# Altium footprint library Components.PcbLib: 139 footprints (part 6 of 9)
Each footprint in its own frame and in the unit in brackets; x right, y up, seen from the top. Pads: shape width x height; smd on the part's side, far side on the other; paste and mask are expansions set on the pad; w line width, h text height; cw(c..) or ccw(c..) is an arc to the next point about the centre after c.
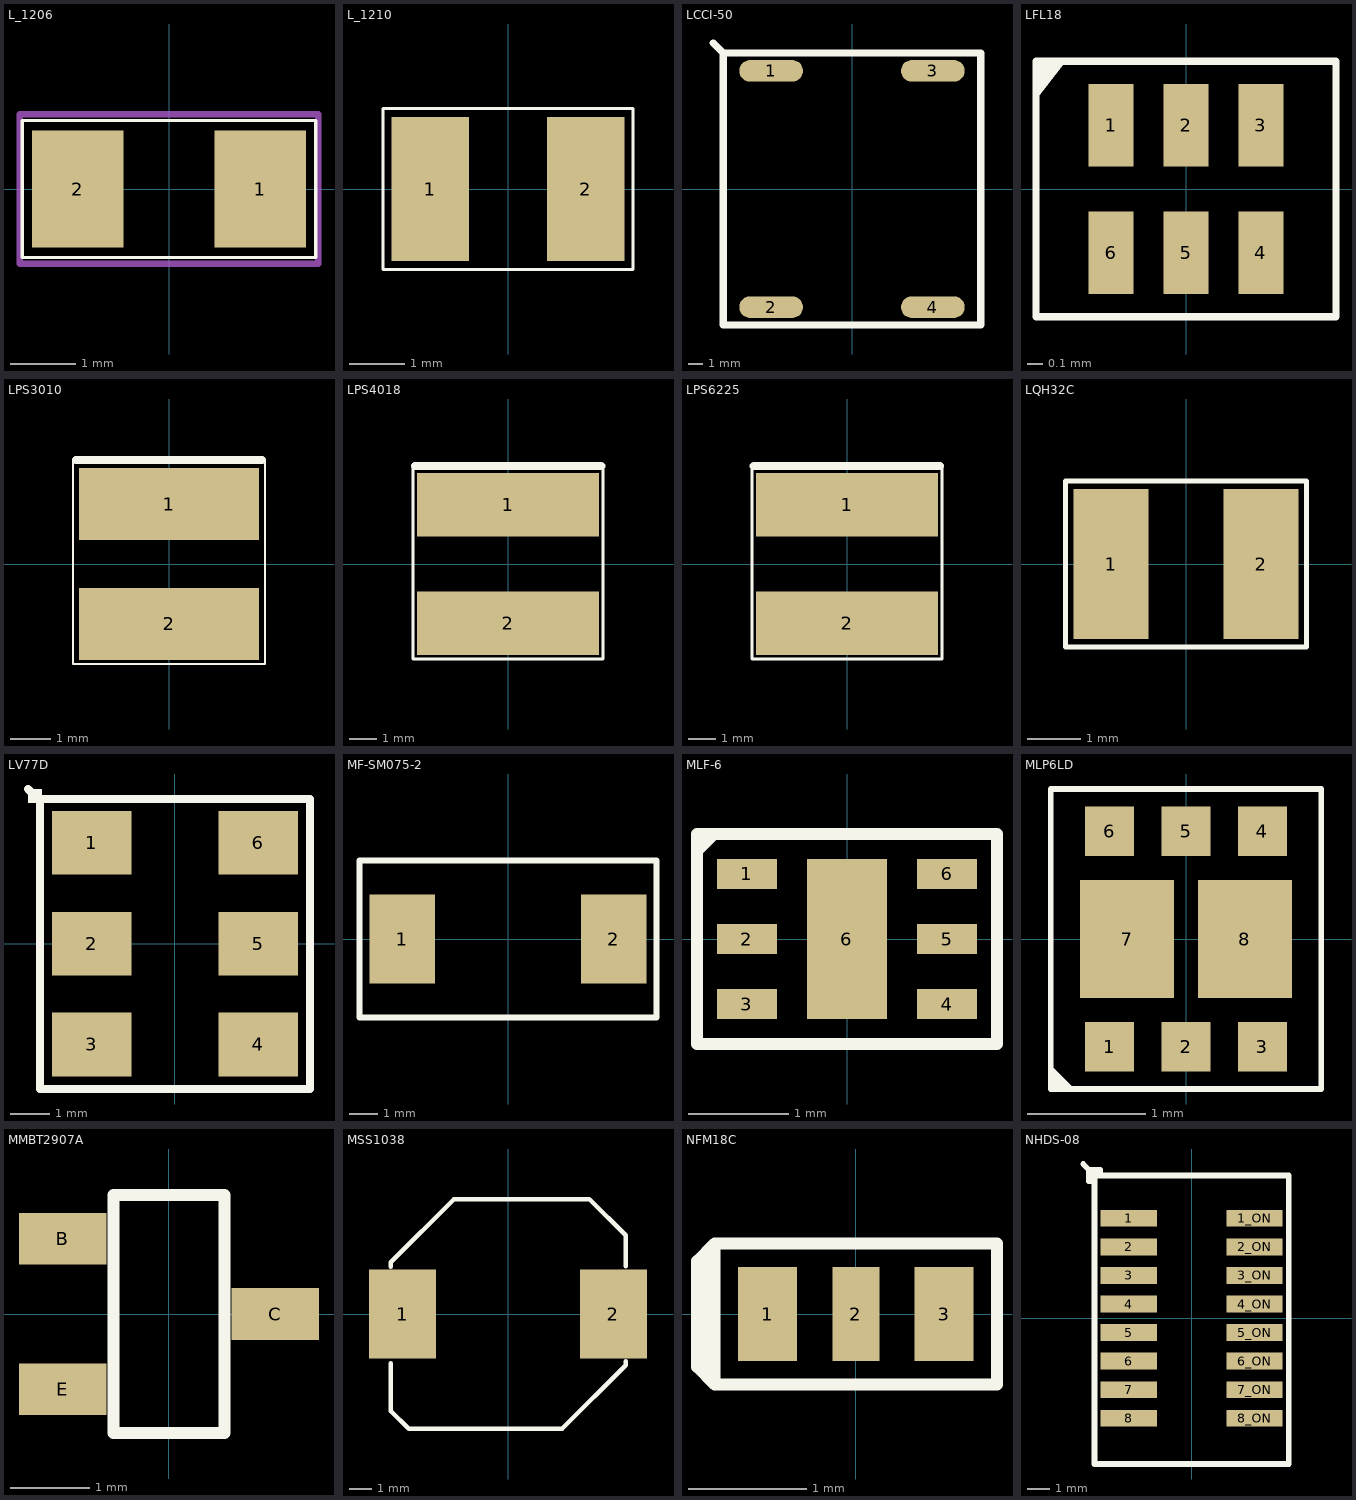
[diagram p5: the footprints below, top view; thin cyan lines are the x and y axes]

## L_1206 [mm]
pads (2):
  rect 1.4x1.8 smd paste-0.1 mask+0.05: 1(1.4,0) 2(-1.4,0)
Top Overlay:
  lines w0.05: -2.25,-1.05 -2.25,1.05 2.25,1.05 2.25,-1.05 -2.25,-1.05
Mechanical 29:
  lines w0.1: -2.286,-1.143 2.286,-1.143 2.286,1.143 -2.286,1.143 -2.286,-1.143
  text ".Designator" at -2.032,-0.381 h0.8
3D body "User Library-V1206HD.STEP": height 1.5, standoff 0, extent -1.6,-0.85 1.6,0.75

## L_1210 [mm]
pads (2):
  rect 1.4x2.6 smd paste-0.1 mask+0.05: 1(-1.4,0) 2(1.4,0)
Top Overlay:
  lines w0.05: -2.25,-1.45 -2.25,1.45 2.25,1.45 2.25,-1.45 -2.25,-1.45
3D body "User Library-V1210HD.STEP": height 1.5, standoff 0, extent -1.61,-1.3 1.59,1.2

## LCCI-50 [mm]
pads (4):
  oval 4.45x1.52 smd paste-0.1: 1(-5.65,8.255) 2(-5.65,-8.255) 3(5.65,8.255) 4(5.65,-8.255)
Top Overlay:
  lines w0.2: -9,9.5 -9,9.5
  lines w0.5: -9.7,10.2 -9,9.5 ; -9,9.5 -9,-9.5 9,-9.5 9,9.5 -9,9.5

## LFL18 [mm]
pads (6):
  rect 0.3x0.55 smd paste-0.03 mask+0.03: 1(-0.5,0.425) 2(0,0.425) 3(0.5,0.425) 4(0.5,-0.425) 5(0,-0.425) 6(-0.5,-0.425)
Top Overlay:
  region: -0.8,0.85 -1,0.6 -1,0.85
  lines w0.05: -1,-0.85 1,-0.85 1,0.85 -1,0.85 -1,-0.85

## LPS3010 [mm]
pads (2):
  rect 4.5x1.8 smd paste-0.2 mask+0.05: 1(0,1.5) 2(0,-1.5)
Top Overlay:
  lines w0.05: -2.4,2.61 -2.4,-2.5 2.4,-2.5 2.4,2.61
  lines w0.2: -2.33,2.6 2.32,2.6
3D body "Coilcraft-LPS4018.step": height 1.8, standoff 0, extent -2.053,-2.053 2.053,2.053

## LPS4018 [mm]
pads (2):
  rect 6.6x2.3 smd paste-0.2 mask+0.05: 1(0,2.15) 2(0,-2.15)
Top Overlay:
  lines w0.1: -3.45,3.49 -3.45,-3.45 3.45,-3.45 3.45,3.5
  lines w0.3: -3.38,3.56 3.39,3.56
3D body "LPS6225.STEP": height 2.5, standoff 0, extent -3.1,-3.103 3.106,3.103

## LPS6225 [mm]
pads (2):
  rect 6.6x2.3 smd paste-0.2 mask+0.05: 1(0,2.15) 2(0,-2.15)
Top Overlay:
  lines w0.1: -3.45,3.5 -3.45,-3.45 3.45,-3.45 3.45,3.49
  lines w0.3: -3.39,3.56 3.38,3.56
3D body "LPS6225.STEP": height 2.5, standoff 0, extent -3.1,-3.103 3.106,3.103

## LQH32C [mm] "Chip Inductor, 2-Leads, Body 2,5x2,5mm, IPC Medium Density"
height 2.2
pads (2):
  rect 1.4x2.8 smd paste-0.1 mask+0.1: 1(-1.4,0) 2(1.4,0)
Top Overlay:
  lines w0.1: -2.25,-1.55 2.25,-1.55 2.25,1.55 -2.25,1.55 -2.25,-1.55
3D body: height 2.2, standoff 0, extent -1.35,-1.35 1.35,1.35

## LV77D [mm]
pads (6):
  rect 2x1.6 smd paste-0.1 mask+0.1: 1(-2.1,2.54) 2(-2.1,0) 3(-2.1,-2.54) 4(2.1,-2.54) 5(2.1,0) 6(2.1,2.54)
Top Overlay:
  rectangle: -3.7,3.54 -3.35,3.89
  lines w0.2: -3.7,3.89 -3.4,3.59 ; -3.4,-3.66 3.4,-3.66 3.4,3.64 -3.4,3.64 -3.4,-3.66
3D body: height 1.7, standoff 0, extent -2.55,-3.61 2.55,3.59

## MF-SM075-2 [mm]
pads (2):
  rect 2.3x3.1 smd paste-0.2: 1(-3.7,0) 2(3.7,0)
Top Overlay:
  lines w0.2: -5.2,-2.75 -5.2,2.75 5.2,2.75 5.2,-2.75 -5.2,-2.75
3D body: height 3.2, standoff 0, extent -5.3,-2.85 5.3,2.85

## MLF-6 [mm]
pads (7):
  rect 0.6x0.3 smd paste-0.03 mask+0.03: 1(-1,0.65) 2(-1,0) 3(-1,-0.65) 4(1,-0.65) 5(1,0) 6(1,0.65)
  rect 0.8x1.6 smd paste-0.08 mask+0.05: 6(0,0)
Top Overlay:
  region: -1.5,1.05 -1.5,0.8 -1.25,1.05
  lines w0.12: -1.5,-1.05 -1.5,1.05 1.5,1.05 1.5,-1.05 -1.5,-1.05
3D body: height 0.9, standoff 0, extent -0.999,-0.999 0.999,0.999

## MLP6LD [mm]
pads (8):
  rect 0.42x0.42 smd paste-0.05 mask+0.05: 1(-0.65,-0.915) 2(0,-0.915) 3(0.65,-0.915) 4(0.65,0.915) 5(0,0.915) 6(-0.65,0.915)
  rect 0.8x1 smd paste-0.1 mask+0.05: 7(-0.5,0) 8(0.5,0)
Top Overlay:
  region: -1.15,-1.075 -0.95,-1.275 -1.15,-1.275
  lines w0.05: -1.15,-1.275 1.15,-1.275 1.15,1.275 -1.15,1.275 -1.15,-1.275

## MMBT2907A [mm]
pads (3):
  rect 1.1x0.65 smd paste-0.05 mask+0.06: B(-1.34,0.95) C(1.34,0) E(-1.34,-0.95)
Top Overlay:
  lines w0.15: -0.7,-1.5 -0.7,1.5 0.7,1.5 0.7,-1.5 -0.7,-1.5
3D body "SW3dPS-3-lead sot23-3.STEP": height 1.05, standoff 0.03, extent -1.276,-1.46 1.2,1.46

## MSS1038 [mm] "Coilcraft"
pads (2):
  rect 3x4 smd paste-0.2 mask+0.1: 1(-4.725,0) 2(4.725,0)
Top Overlay:
  lines w0.2: -5.25,-2.2 -5.25,-4.35 -4.45,-5.15 2.425,-5.15 5.275,-2.3 5.275,-2.125 ; -5.25,2.125 -5.25,2.325 -2.425,5.15 3.65,5.15 5.275,3.525 5.275,2.15
3D body "Coilcraft-MSS1038.step": height 4, standoff 0, extent -5.15,-5.1 5.15,5.1

## NFM18C [mm]
pads (3):
  rect 0.5x0.8 smd paste-0.04 mask+0.05: 1(-0.75,0) 3(0.75,0)
  rect 0.4x0.8 smd paste-0.04 mask+0.05: 2(0,0)
Top Overlay:
  lines w0.1: -1.275,-0.525 -1.275,0.525 ; -1.2,-0.6 -1.35,-0.45 -1.35,0.45 -1.2,0.6 ; -1.2,-0.6 1.2,-0.6 1.2,0.6 -1.2,0.6 ; -1.2,-0.6 -1.2,0.6
3D body: height 0.7, standoff 0, extent -0.914,-0.513 0.913,0.514

## NHDS-08 [mm]
pads (16):
  rect 2.5x0.75 smd paste-0.07 mask+0.07: 1(-2.794,4.445) 1_ON(2.794,4.445) 2(-2.794,3.175) 2_ON(2.794,3.175) 3(-2.794,1.905) 3_ON(2.794,1.905) 4(-2.794,0.635) 4_ON(2.794,0.635) 5(-2.794,-0.635) 5_ON(2.794,-0.635) 6(-2.794,-1.905) 6_ON(2.794,-1.905) 7(-2.794,-3.175) 7_ON(2.794,-3.175) 8(-2.794,-4.445) 8_ON(2.794,-4.445)
Top Overlay:
  lines w0.254: -4.826,6.858 -4.318,6.35 ; -4.318,6.096 -4.572,6.096 -4.572,6.604 -4.064,6.604 -4.064,6.35 ; -4.318,6.35 -4.318,-6.477 4.318,-6.477 4.318,6.35 -4.318,6.35
3D body "DHN8.STEP": height 1.5, standoff 0, extent -3.5,-5.695 3.477,5.695